# Altium schematic symbol library My_Intlib.SchLib: 107 symbols (part 1 of 2) (continued)
## GD32F307VGT6 (continued)

## Header 2
designator P?
2P接插件; LatestRevisionDate: 17-Jul-2002; LatestRevisionNote: Re-released for DXP Platform.; Publisher: Altium Limited
footprint HDR-1X2_H (弯脚排针，2脚)
footprint HDR-1x2 (排针，2脚)
footprint HDR-1X2_M (排母，2脚)
footprint HDR-1X2_Y (圆孔排母，2脚)
footprint KF128-5.08-2P (螺钉式接线端子，脚距5.08mm)
footprint KF2EDGK5.08-LI-2P (立插端子)
footprint KF2EDGK5.08-WI-2P (卧插端子)
footprint XH2.54-2P
footprint XH2.54-WS-2P (长：10mm，宽：8mm，高：6.1mm)
pins: 1, 2

## Header 3
designator P?
3P接插件; LatestRevisionDate: 17-Jul-2002; LatestRevisionNote: Re-released for DXP Platform.; Publisher: Altium Limited
footprint HDR1X3 (Connector; Header; 3 Position)
footprint HDR-1X3_M (排母，3脚)
footprint HDR-1X3_H (弯脚排针，3脚)
footprint HDR-1X3_Y (圆孔排母，3脚)
pins: 1, 2, 3

## Header 4
designator JP?, comment HDR-1X4  (value not drawn)
4P接插件; 版权归属: 源创客; BOM名称: 4P接插件; 学习资源: www.ooocke.com
footprint XH2.54-WI-4P (接插件，4P)
footprint XH2.54-LI-4P (接插件，4P)
footprint HDR2.54-LI-4P (Footprint not found)
footprint HDR2.54-M-LI-4P (排母，4脚)
footprint HDR2.54-WI-4P (弯脚排针，4脚)
footprint HDR2.54-Y-LI-4P (圆孔排母，4脚)
footprint HDR2.54-M-WS-4P (4P卧式贴片排母2.54)
footprint XH2.54-WS-4P (长：15mm，宽：8mm，高：6.1mm)
pins: 1, 2, 3, 4

## Header 5
designator JP?, comment HDR-1X5  (value not drawn)
5P接插件; 版权归属: 源创客; BOM名称: 5P接插件; 学习资源: www.ooocke.com
footprint XH2.54-WI-5P (接插件，5P)
footprint XH2.54-LI-5P (接插件，5P)
footprint HDR2.54-LI-5P (排针，5脚)
footprint HDR2.54-M-LI-5P (排母，5脚)
footprint HDR2.54-WI-5P (弯脚排针，5脚)
footprint HDR2.54-WS-5P (5P卧式贴片排针2.54)
footprint HDR2.54-Y-LI-5P (圆孔排母，5脚)
footprint HDR2.54-M-WS-5P (5P卧式贴片排母2.54)
footprint KF2510-LI-5P (接插件/2A)
footprint XH2.54-WS-5P (长：17.5mm，宽：8mm，高：6.1mm)
footprint XH2.54-LS-5P (长：17.5mm，宽：6mm，高：8.3mm)
footprint KF2EDGK-2.54-LI-5P (长：14.6mm，宽：8.1mm，高：10.1mm)
footprint KF2EDGK-2.54-WI-5P (长：14.6mm，宽：10.1mm，高：8.1mm)
pins: 1, 2, 3, 4, 5

## Header 5_With_PAD
designator JP?, comment HDR-1X5  (value not drawn)
5P接插件; 版权归属: 源创客; BOM名称: 5P接插件; 学习资源: www.ooocke.com
footprint PH2.0-WS-5P (长：14mm，宽：7.6mm，高：5.5mm)
pins: 0, 1, 2, 3, 4, 5

## Header 10
designator JP?, comment HDR-1X10  (value not drawn)
10P接插件; 版权归属: 源创客; BOM名称: 10P接插件; 学习资源: www.ooocke.com
footprint XH2.54-WI-10P (接插件，10P)
footprint XH2.54-LI-10P (接插件，10P)
footprint HDR2.54-LI-10P (排针，10脚)
footprint HDR2.54-M-LI-10P (排母，10脚)
footprint HDR2.54-WI-10P (弯脚排针，10脚)
footprint HDR2.54-WS-10P (10P卧式贴片排针2.54)
footprint HDR2.54-Y-LI-10P (圆孔排母，10脚)
footprint HDR2.54-M-WS-10P (10P卧式贴片排母2.54)
footprint KF2510-LI-10P (接插件/2A)
footprint XH2.54-WS-10P (长：30mm，宽：8mm，高：6.1mm)
footprint XH2.54-LS-10P (长：30mm，宽：6mm，高：8.3mm)
footprint KF2EDGK-2.54-LI-10P (长：27.3mm，宽：8.1mm，高：10.1mm)
footprint KF2EDGK-2.54-WI-10P (长：27.3mm，宽：10.1mm，高：8.1mm)
pins: 1, 2, 3, 4, 5, 6, 7, 8, 9, 10

## Header 10X2
designator P?
Header, 10-Pin, Dual row; LatestRevisionDate: 17-Jul-2002; LatestRevisionNote: Re-released for DXP Platform.; Publisher: Altium Limited
footprint HDR-10X2 (双排排针，10x2脚)
footprint HDR-10X2_H
pins: 1, 2, 3, 4, 5, 6, 7, 8, 9, 10, 11, 12, 13, 14, 15, 16, 17, 18, 19, 20

## Header 20X2
designator P?
Header, 40-Pin, HDR-SMD_2*20P-P2.54; LatestRevisionDate: 17-Jul-2002; LatestRevisionNote: Re-released for DXP Platform.; Publisher: Altium Limited
footprint HDR-SMD_2*20P-P2.54 (贴片式排母，2*20p，脚距2.54mm，高度8.5mm)
pins: 1, 2, 3, 4, 5, 6, 7, 8, 9, 10, 11, 12, 13, 14, 15, 16, 17, 18, 19, 20, 21, 22, 23, 24, 25, 26, 27, 28, 29, 30, 31, 32, 33, 34, 35, 36, 37, 38, 39, 40

## IRF540N
designator Q?
N沟场 100V/22A; BOM名称: 效应管; 版权归属: 源创客; 学习资源: www.ooocke.com; 描述: N沟场 100V/22A
footprint TO263-3B (263，3脚晶体管)
footprint TO220A (220，3脚晶体管)
pins: 1 G, 2 S, 3 D

## Jump
designator J?
跳线帽
footprint Jump
pins: 1, 2

## KF128-5.08MM-2P
designator J?, comment 3.3V电源输出
大接线端子，绿; ComponentLink1URL: https://detail.tmall.com/item.htm?spm=a1z10.5-b.w4011-14865958799.193.B0p41N&id=45905508377&rn=e90e7252b5175cd006380c5c01151190&abbucket=9; price: 0.5; Supplier: Farpu; SuppliersPartNumber: *; Manufacturer: *; ComponentLink1Description: 供应商链接
footprint WJ500V-5.08-2
pins: 1, 2

## L_SMD
designator L?
贴片电感
footprint L0402
footprint L0603
footprint L0805
footprint L1206
pins: 1, 2

## LD3320
designator U?
“语音识别” 专用芯片; Manufacturer_Name: Electrodragon; Datasheet Link: http://www.electrodragon.com/w/LD3320_Datasheet; Height: 0.9mm; Manufacturer_Part_Number: LD3320
footprint QFN50P700X700X90-49N-D
pins: 1 VDDIO_1 (power), 2 RESERVED_1, 3 RESERVED_2, 4 RESERVED_3, 5 RESERVED_4, 6 RESERVED_5, 7 VDD (power), 8 GNDD_1 (power), 9 MICP, 10 MICN, 11 MONO, 12 MBS, 13 LINL, 14 LINR, 15 HPOL, 16 HPOR, 17 GNDA_1 (power), 18 VREF (power), 19 VDDA_1 (power), 20 EQ1, 21 EQ2, 22 EQ3, 23 VDDA_2 (power), 24 GNDA_2 (power), 25 SPON, 26 SPOP, 27 LOUTL, 28 LOUTR, 29 RESERVED_6, 30 RESERVED_7, 31 CLK (in), 32 VDDIO_2 (power), 33 GNDD_2 (power), 34 P7, 35 P6, 36 P5, 37 P4, 38 P3, 39 P2/SDCK, 40 P1/SDO, 41 P0/SDI, 42 ~{WRB}/~{SPIS}, 43 ~{CBS}/~{SCS}, 44 A0, 45 ~{RDB}, 46 MD, 47 ~{RSTB}, 48 ~{INTB}, 49 EP

## LED_B
designator LED?, comment B
蓝色LED; Published: 8-Jun-2000; Revision: July-2002: Re-released for DXP Platform.; Publisher: Altium Limited
footprint LED 3MM-B (蓝色3mm直插LED)
footprint LED 5MM-B (蓝色5mm直插LED)
footprint LED 0805B (蓝色0805LED)
footprint LED F234-B (蓝色2mm*3mm*4mm(长*宽*高))
footprint LED 0603B (蓝色0603LED)
pins: 1 A, 2 K

## LED_G
designator LED?, comment G
绿色LED; Published: 8-Jun-2000; Revision: July-2002: Re-released for DXP Platform.; Publisher: Altium Limited
footprint LED 3MM-G (绿色3mm直插LED)
footprint LED 5MM-G (绿色5mm直插LED)
footprint LED 0805G (绿色0805LED)
footprint LED F234-G (绿色2mm*3mm*4mm(长*宽*高))
footprint LED 0603G (绿色0603LED)
pins: 1 A, 2 K

## LED_R
designator LED?, comment R
红色LED; Published: 8-Jun-2000; Revision: July-2002: Re-released for DXP Platform.; Publisher: Altium Limited
footprint LED 3MM-R (红色3mm直插LED)
footprint LED 5MM-R (红色5mm直插LED)
footprint LED 0805R (红色0805LED)
footprint LED F234-R (红色2mm*3mm*4mm(长*宽*高))
footprint LED 0603R (红色0603LED)
pins: 1 A, 2 K

## LED_R&G
designator LED?
LED红绿双色，0805，1.6mm*1.5mm; Published: 8-Jun-2000; Revision: July-2002: Re-released for DXP Platform.; Publisher: Altium Limited
footprint LED 0805_R&G (LED红绿双色，0805，1.6mm*1.5mm)
footprint LED 0603-RG (1.5x1.6 mm)
pins: 1 K, 2 K, 3 A, 4 A

## LED_R&G&Y
designator LED?
LED红绿黄3色，5050，5mm*5mm; Published: 8-Jun-2000; Revision: July-2002: Re-released for DXP Platform.; Publisher: Altium Limited
footprint LED 5050 R&G&Y (LED红绿黄3色，5050，5mm*5mm)
pins: 1 K, 2 A, 3 K, 4 A, 5 K, 6 A

## LED_Y
designator LED?, comment Y
黄色LED; Published: 8-Jun-2000; Revision: July-2002: Re-released for DXP Platform.; Publisher: Altium Limited
footprint LED 3MM-Y (黄色3mm直插LED)
footprint LED 5MM-Y (黄色5mm直插LED)
footprint LED 0805Y (黄色0805LED)
footprint LED F234-Y (黄色2mm*3mm*4mm(长*宽*高))
footprint LED 0603Y (黄色0603LED)
pins: 1 A, 2 K

## LMR14020SQDPRRQ1
designator U?
TI的降压转换器，具有 40uA IQ 的 SIMPLE SWITCHER®、汽车类 40V、2A 2.2MHz
footprint WSON-10
pins: 1 BOOT (power), 2 VIN (power), 3 VIN (power), 4 EN (in), 5 RT/SYNC (in), 6 SS, 7 FB (in), 8 PGOOD (in), 9 GND (power), 10 SW, 11 PAD (power)

## LMR51420XDDCR
designator U?
DC/DC 降压转换器 / 500KHz，PFM，Adjustable; Manufacturer_Part_Number: LMR51420XFDDCR; Height: 1.1mm; Mouser Part Number: 595-LMR51420XFDDCR
footprint SOT95P280X110-6N
pins: 1 GND, 2 SW, 3 VIN, 4 FB, 5 EN, 6 CB

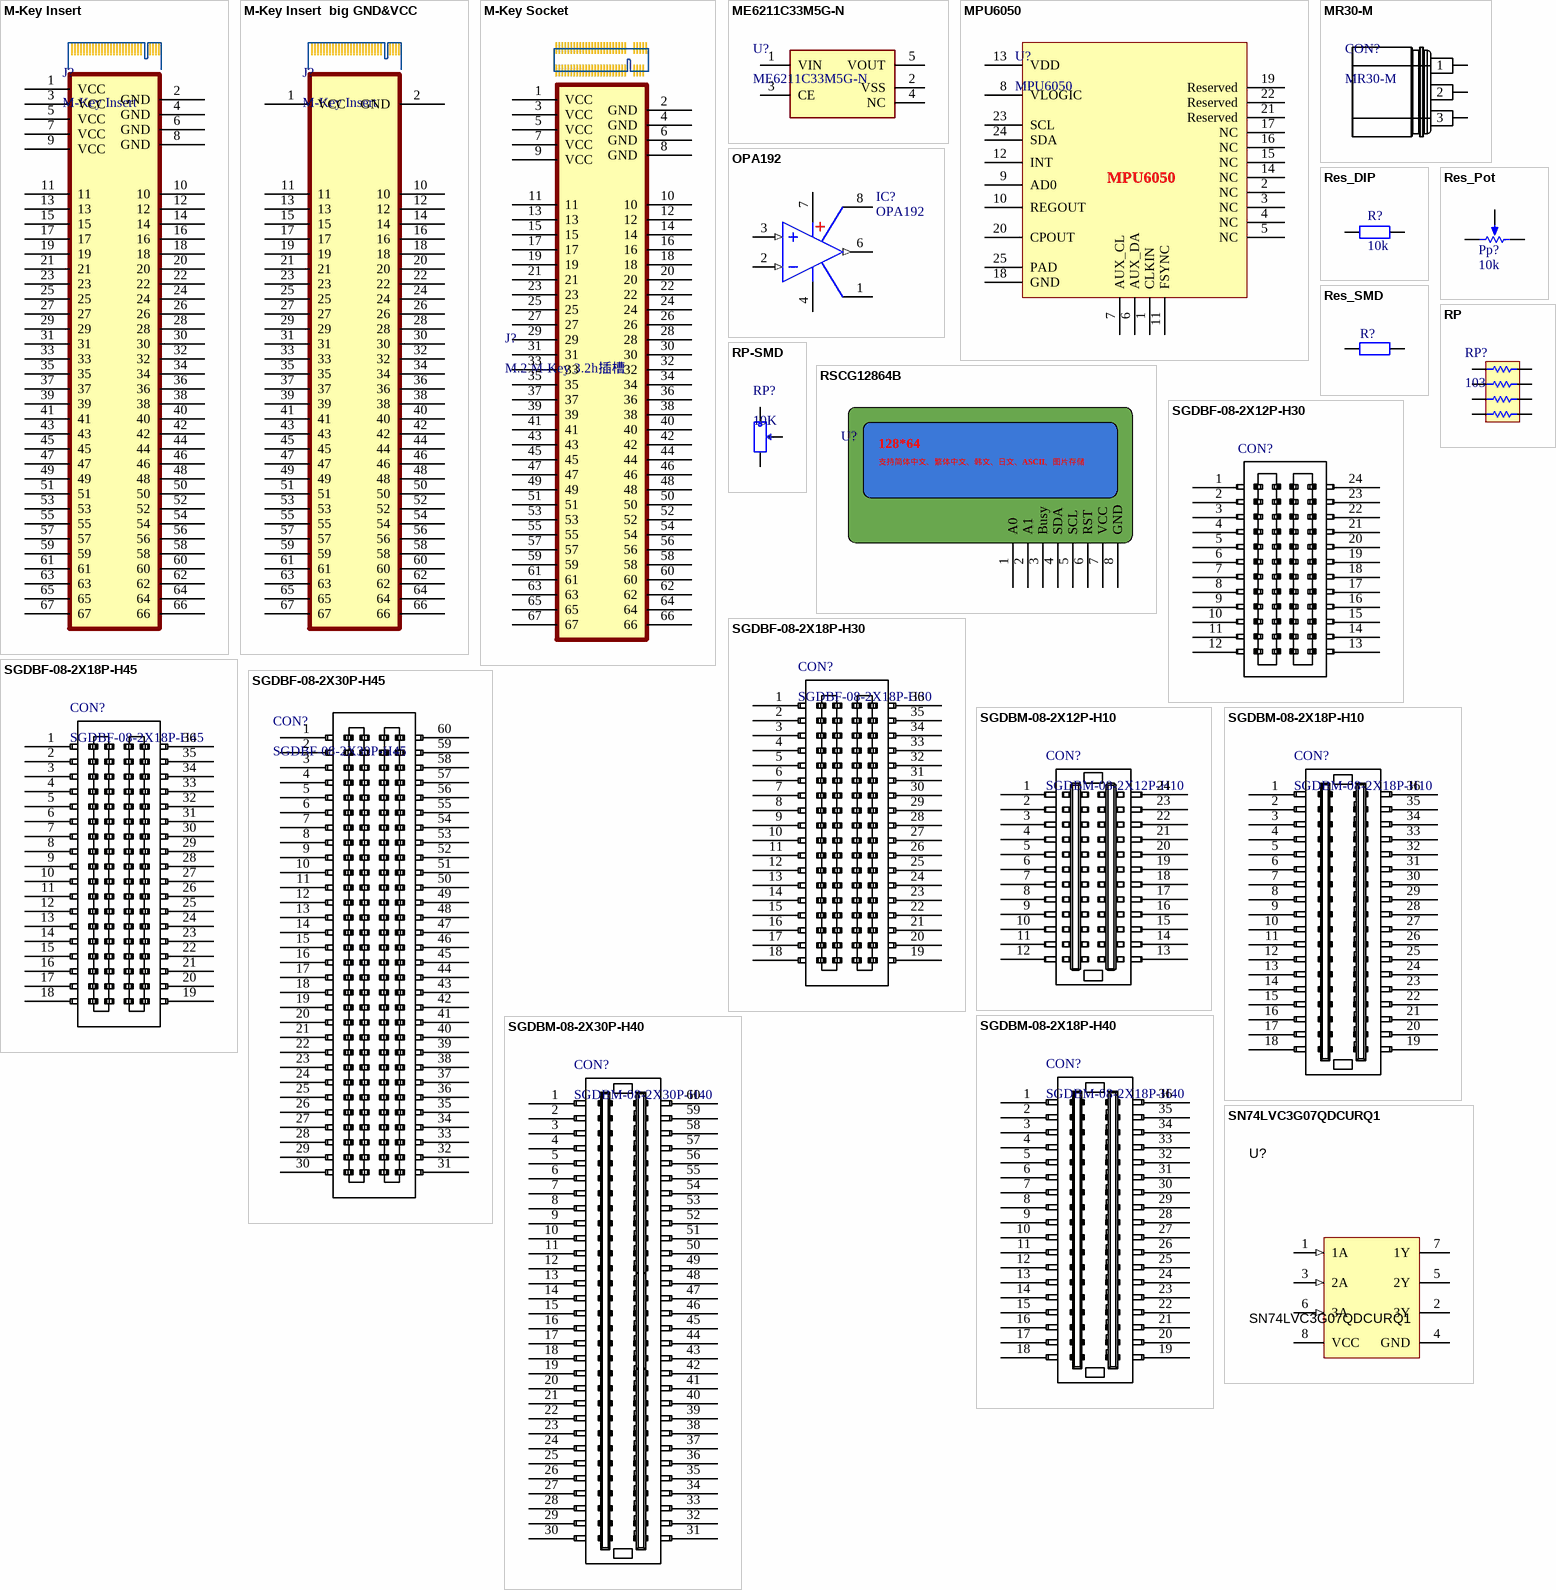
[diagram p3: symbols M-Key Insert to SN74LVC3G07QDCURQ1]

## M-Key Insert
designator J?
M.2 金手指
footprint M-Key Insert (M.2 金手指)
pins: 1 VCC, 2 GND, 3 VCC, 4 GND, 5 VCC, 6 GND, 7 VCC, 8 GND, 9 VCC, 10, 11, 12, 13, 14, 15, 16, 17, 18, 19, 20, 21, 22, 23, 24, 25, 26, 27, 28, 29, 30, 31, 32, 33, 34, 35, 36, 37, 38, 39, 40, 41, 42, 43, 44, 45, 46, 47, 48, 49, 50, 51, 52, 53, 54, 55, 56, 57, 58, 59, 60, 61, 62, 63, 64, 65, 66, 67

## M-Key Insert  big GND&VCC
designator J?, comment M-Key Insert
M.2 金手指
footprint M-Key Insert big GND&VCC (M.2 金手指)
pins: 1 VCC, 2 GND, 10, 11, 12, 13, 14, 15, 16, 17, 18, 19, 20, 21, 22, 23, 24, 25, 26, 27, 28, 29, 30, 31, 32, 33, 34, 35, 36, 37, 38, 39, 40, 41, 42, 43, 44, 45, 46, 47, 48, 49, 50, 51, 52, 53, 54, 55, 56, 57, 58, 59, 60, 61, 62, 63, 64, 65, 66, 67

## M-Key Socket
designator J?, comment M.2 M-Key 3.2h插槽
footprint M-Key Socket (M.2 M-Key 3.2h插槽)
pins: 1 VCC, 2 GND, 3 VCC, 4 GND, 5 VCC, 6 GND, 7 VCC, 8 GND, 9 VCC, 10, 11, 12, 13, 14, 15, 16, 17, 18, 19, 20, 21, 22, 23, 24, 25, 26, 27, 28, 29, 30, 31, 32, 33, 34, 35, 36, 37, 38, 39, 40, 41, 42, 43, 44, 45, 46, 47, 48, 49, 50, 51, 52, 53, 54, 55, 56, 57, 58, 59, 60, 61, 62, 63, 64, 65, 66, 67

## ME6211C33M5G-N
designator U?
LDO芯片，Vin(max)=6V，Vout=3V3，Iout=500mA; Manufacturer_Name: Microne; Datasheet Link: https://datasheet.lcsc.com/szlcsc/1811131510_MICRONE-Nanjing-Micro-One-Elec-ME6211C33M5G-N_C82942.pdf; Height: 1.45mm; Manufacturer_Part_Number: ME6211C33M5G-N
footprint SOT95P270X145-5N
pins: 1 VIN, 2 VSS, 3 CE, 4 NC, 5 VOUT

## MPU6050
designator U?
6轴惯性传感器，只支持IIC协议
footprint QFN24 4x4_N (24脚，长x宽x高：4x4x1mm，脚距：0.5mm)
pins: 1 CLKIN, 2 NC, 3 NC, 4 NC, 5 NC, 6 AUX_DA, 7 AUX_CL, 8 VLOGIC, 9 AD0, 10 REGOUT, 11 FSYNC, 12 INT, 13 VDD, 14 NC, 15 NC, 16 NC, 17 NC, 18 GND, 19 Reserved, 20 CPOUT, 21 Reserved, 22 Reserved, 23 SCL, 24 SDA, 25 PAD

## MR30-M
designator CON?
MR30公头，航模插头连接器大电流
footprint MR30-M (MR30公头，航模插头连接器大电流)
pins: 1, 2, 3

## OPA192
designator IC?
High-Voltage, Rail-to-Rail Input/Output, 5µV, 0.2µV/˚C, Precision Operational Amplifier; BOM名称: 单路精密运放; 版权归属: 源创客; 学习资源: www.ooocke.com
footprint SOP8_N (5*6*1.8mm（长宽高）)
footprint DIP8-300_MH
pins: 1, 2 IN- (in), 3 IN+ (in), 4 V- (power), 6 OUT (out), 7 V+ (power), 8

## Res_DIP
designator R?, comment 10k
直插电阻
footprint RS 1/4W (直插色环电阻，脚距9mm，直径2.3mm)
pins: 1, 2

## Res_Pot
designator Pp?, comment 10k
电位器; 购买链接: https://item.taobao.com/item.htm?spm=a230r.1.14.90.21641e34zQj3ul&id=19303265869&ns=1&abbucket=13#detail
footprint RM065
footprint RP_3296
pins: 1 TOP, 2 TAP, 3 BOT

## Res_SMD
designator R?
贴片电阻; Value: 1K; Published: 8-Jun-2000; LatestRevisionDate: 17-Jul-2002; LatestRevisionNote: Re-released for DXP Platform.; PackageReference: AXIAL-0.4; Publisher: Altium Limited; PackageDescription: Axial Device, Thru-Hole; 2 Leads; 0.4 in Pin Spacing
footprint R0402
footprint R0603
footprint R0805
footprint R1206
pins: 1, 2

## RP
designator RP?, comment 103
贴片网络排阻; 版权归属: 源创客; BOM名称: 贴片网络排阻; 学习资源: www.ooocke.com
footprint RCA-8P4R-0603 (3.2mm*1.6mm*0.6mm(长*宽*厚))
pins: 1, 2, 3, 4, 5, 6, 7, 8

## RP-SMD
designator RP?, comment 10K
贴片电位器; 版权归属: 源创客; BOM名称: 贴片电位器; 学习资源: www.ooocke.com
footprint 3303W (3.5*3.1*1.5mm)
pins: 1, 2, 3

## RSCG12864B
designator U?  (value not drawn)
128*64点阵屏，I2C通信，RSCG12864B
footprint HDR-1X8_M (排母，8脚)
pins: 1 A0, 2 A1, 3 Busy, 4 SDA, 5 SCL, 6 RST, 7 VCC, 8 GND
text: 128*64; 支持简体中文、繁体中文、韩文、日文、ASCII、图片存储

## SGDBF-08-2X12P-H30
designator CON?  (value not drawn)
板对板连接器，母端，脚距0.8mm，2*12pin，高3mm
footprint SGDBF-08-2X12P-H30 (板对板连接器，母端，脚距0.8mm，2*12pin，高3mm)
pins: 1, 2, 3, 4, 5, 6, 7, 8, 9, 10, 11, 12, 13, 14, 15, 16, 17, 18, 19, 20, 21, 22, 23, 24

## SGDBF-08-2X18P-H30
designator CON?
板对板连接器，母端，脚距0.8mm，2*18pin，高3mm
footprint SGDBF-08-2X18P-H30 (板对板连接器，母端，脚距0.8mm，2*18pin，高3mm)
pins: 1, 2, 3, 4, 5, 6, 7, 8, 9, 10, 11, 12, 13, 14, 15, 16, 17, 18, 19, 20, 21, 22, 23, 24, 25, 26, 27, 28, 29, 30, 31, 32, 33, 34, 35, 36

## SGDBF-08-2X18P-H45
designator CON?
板对板连接器，母端，脚距0.8mm，2*18pin，高4.5mm
footprint SGDBF-08-2X18P-H45 (板对板连接器，母端，脚距0.8mm，2*18pin，高4.5mm)
pins: 1, 2, 3, 4, 5, 6, 7, 8, 9, 10, 11, 12, 13, 14, 15, 16, 17, 18, 19, 20, 21, 22, 23, 24, 25, 26, 27, 28, 29, 30, 31, 32, 33, 34, 35, 36

## SGDBF-08-2X30P-H45
designator CON?
板对板连接器，母端，脚距0.8mm，2*30pin，高4.5mm
footprint SGDBF-08-2X30P-H45 (板对板连接器，母端，脚距0.8mm，2*30pin，高4.5mm)
pins: 1, 2, 3, 4, 5, 6, 7, 8, 9, 10, 11, 12, 13, 14, 15, 16, 17, 18, 19, 20, 21, 22, 23, 24, 25, 26, 27, 28, 29, 30, 31, 32, 33, 34, 35, 36, 37, 38, 39, 40, 41, 42, 43, 44, 45, 46, 47, 48, 49, 50, 51, 52, 53, 54, 55, 56, 57, 58, 59, 60

## SGDBM-08-2X12P-H10
designator CON?
板对板连接器，公端，脚距0.8mm，2*12pin，高1mm
footprint SGDBM-08-2X12P-H10 (板对板连接器，公端，脚距0.8mm，2*12pin，高1mm)
pins: 1, 2, 3, 4, 5, 6, 7, 8, 9, 10, 11, 12, 13, 14, 15, 16, 17, 18, 19, 20, 21, 22, 23, 24

## SGDBM-08-2X18P-H10
designator CON?
板对板连接器，公端，脚距0.8mm，2*18pin，高1mm
footprint SGDBM-08-2X18P-H10 (板对板连接器，公端，脚距0.8mm，2*18pin，高1mm)
pins: 1, 2, 3, 4, 5, 6, 7, 8, 9, 10, 11, 12, 13, 14, 15, 16, 17, 18, 19, 20, 21, 22, 23, 24, 25, 26, 27, 28, 29, 30, 31, 32, 33, 34, 35, 36

## SGDBM-08-2X18P-H40
designator CON?
板对板连接器，公端，脚距0.8mm，2*18pin，高4mm
footprint SGDBM-08-2X18P-H40 (板对板连接器，公端，脚距0.8mm，2*18pin，高4mm)
pins: 1, 2, 3, 4, 5, 6, 7, 8, 9, 10, 11, 12, 13, 14, 15, 16, 17, 18, 19, 20, 21, 22, 23, 24, 25, 26, 27, 28, 29, 30, 31, 32, 33, 34, 35, 36

## SGDBM-08-2X30P-H40
designator CON?
板对板连接器，公端，脚距0.8mm，2*30pin，高4mm
footprint SGDBM-08-2X30P-H40 (板对板连接器，公端，脚距0.8mm，2*30pin，高4.0mm)
pins: 1, 2, 3, 4, 5, 6, 7, 8, 9, 10, 11, 12, 13, 14, 15, 16, 17, 18, 19, 20, 21, 22, 23, 24, 25, 26, 27, 28, 29, 30, 31, 32, 33, 34, 35, 36, 37, 38, 39, 40, 41, 42, 43, 44, 45, 46, 47, 48, 49, 50, 51, 52, 53, 54, 55, 56, 57, 58, 59, 60

## SN74LVC3G07QDCURQ1
designator U?
TRIPLE BUFFER/DRIVER WITH OPEN-DRAIN OUTPUTS, DCU0008A; Manufacturer: Texas Instruments; SymbolCreator: a0412235; CompType: IC; U/M: EA; SymbolVersion: 2014-08-13; PartNumber: SN74LVC3G07QDCURQ1; PackageReference: DCU0008A; MountType: SMT; ComponentLink1Description: Datasheet Link; ComponentLink1URL: http://www.ti.com/lit/ds/symlink/sn74lvc3g07-q1.pdf; RoHS: Y; Publisher: Texas Instruments; LatestRevisionDate: 2015-12-28; Alternate Manufacturer: Texas Instruments
footprint SOP50P310X90-8N
pins: 1 1A (in), 2 3Y (oc), 3 2A (in), 4 GND (power), 5 2Y (oc), 6 3A (in), 7 1Y (oc), 8 VCC (power)

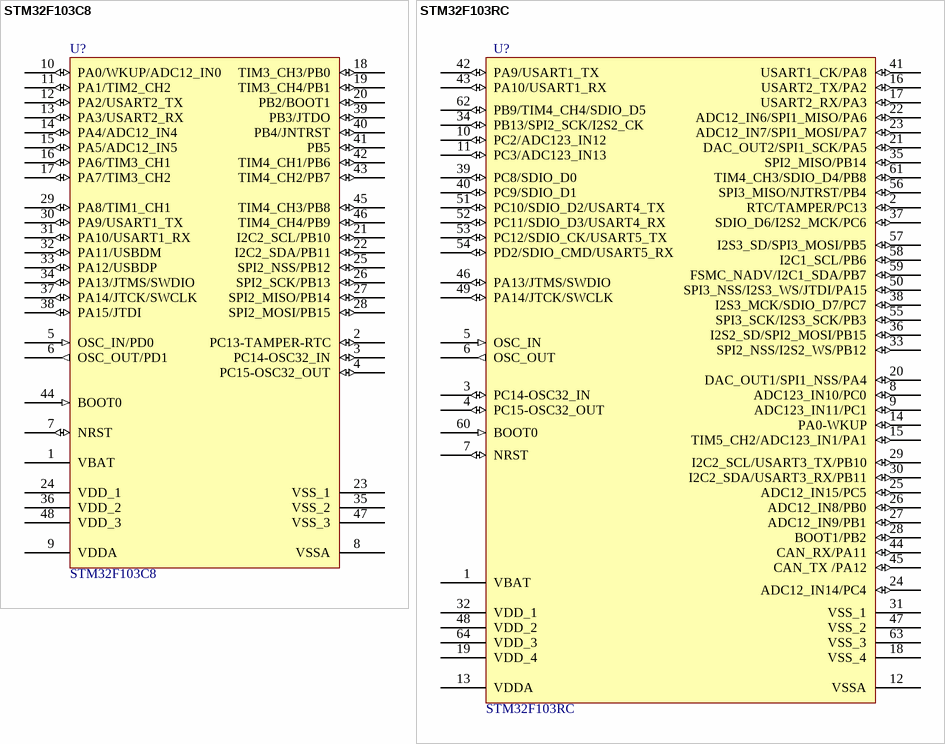
[diagram p4: symbols STM32F103C8 to STM32F103RC]

## STM32F103C8
designator U?
Flaah:64/RAM:20/IO:36; BOM名称: 32位STM单片机
footprint LQFP48 7X7_N (48脚，体宽7x7mm，脚距0.5mm)
pins: 1 VBAT (power), 2 PC13-TAMPER-RTC (io), 3 PC14-OSC32_IN (io), 4 PC15-OSC32_OUT (io), 5 OSC_IN/PD0 (in), 6 OSC_OUT/PD1 (out), 7 NRST (io), 8 VSSA (power), 9 VDDA (power), 10 PA0/WKUP/ADC12_IN0 (io), 11 PA1/TIM2_CH2 (io), 12 PA2/USART2_TX (io), 13 PA3/USART2_RX (io), 14 PA4/ADC12_IN4 (io), 15 PA5/ADC12_IN5 (io), 16 PA6/TIM3_CH1  (io), 17 PA7/TIM3_CH2 (io), 18 TIM3_CH3/PB0 (io), 19 TIM3_CH4/PB1 (io), 20 PB2/BOOT1 (io), 21 I2C2_SCL/PB10 (io), 22 I2C2_SDA/PB11 (io), 23 VSS_1 (power), 24 VDD_1 (power), 25 SPI2_NSS/PB12 (io), 26 SPI2_SCK/PB13 (io), 27 SPI2_MISO/PB14 (io), 28 SPI2_MOSI/PB15 (io), 29 PA8/TIM1_CH1 (io), 30 PA9/USART1_TX (io), 31 PA10/USART1_RX (io), 32 PA11/USBDM (io), 33 PA12/USBDP (io), 34 PA13/JTMS/SWDIO (io), 35 VSS_2 (power), 36 VDD_2 (power), 37 PA14/JTCK/SWCLK (io), 38 PA15/JTDI (io), 39 PB3/JTDO (io), 40 PB4/JNTRST (io), 41 PB5 (io), 42 TIM4_CH1/PB6 (io), 43 TIM4_CH2/PB7 (io), 44 BOOT0 (in), 45 TIM4_CH3/PB8 (io), 46 TIM4_CH4/PB9 (io), 47 VSS_3 (power), 48 VDD_3 (power)

## STM32F103RC
designator U?
32位STM单片机; BOM名称: 32位STM单片机
footprint LQFP64 10X10_N (64脚，体宽10x10mm，脚距0.5mm)
pins: 1 VBAT (power), 2 RTC/TAMPER/PC13 (io), 3 PC14-OSC32_IN (io), 4 PC15-OSC32_OUT (io), 5 OSC_IN (in), 6 OSC_OUT (out), 7 NRST (io), 8 ADC123_IN10/PC0 (io), 9 ADC123_IN11/PC1 (io), 10 PC2/ADC123_IN12 (io), 11 PC3/ADC123_IN13 (io), 12 VSSA (power), 13 VDDA (power), 14 PA0-WKUP (io), 15 TIM5_CH2/ADC123_IN1/PA1 (io), 16 USART2_TX/PA2 (io), 17 USART2_RX/PA3 (io), 18 VSS_4 (power), 19 VDD_4 (power), 20 DAC_OUT1/SPI1_NSS/PA4 (io), 21 DAC_OUT2/SPI1_SCK/PA5 (io), 22 ADC12_IN6/SPI1_MISO/PA6 (io), 23 ADC12_IN7/SPI1_MOSI/PA7 (io), 24 ADC12_IN14/PC4 (io), 25 ADC12_IN15/PC5 (io), 26 ADC12_IN8/PB0 (io), 27 ADC12_IN9/PB1 (io), 28 BOOT1/PB2 (io), 29 I2C2_SCL/USART3_TX/PB10 (io), 30 I2C2_SDA/USART3_RX/PB11 (io), 31 VSS_1, 32 VDD_1 (power), 33 SPI2_NSS/I2S2_WS/PB12 (io), 34 PB13/SPI2_SCK/I2S2_CK (io), 35 SPI2_MISO/PB14 (io), 36 I2S2_SD/SPI2_MOSI/PB15 (io), 37 SDIO_D6/I2S2_MCK/PC6 (io), 38 I2S3_MCK/SDIO_D7/PC7 (io), 39 PC8/SDIO_D0 (io), 40 PC9/SDIO_D1 (io), 41 USART1_CK/PA8 (io), 42 PA9/USART1_TX (io), 43 PA10/USART1_RX (io), 44 CAN_RX/PA11 (io), 45 CAN_TX /PA12 (io), 46 PA13/JTMS/SWDIO (io), 47 VSS_2, 48 VDD_2 (power), 49 PA14/JTCK/SWCLK (io), 50 SPI3_NSS/I2S3_WS/JTDI/PA15 (io), 51 PC10/SDIO_D2/USART4_TX (io), 52 PC11/SDIO_D3/USART4_RX (io), 53 PC12/SDIO_CK/USART5_TX (io), 54 PD2/SDIO_CMD/USART5_RX (io), 55 SPI3_SCK/I2S3_SCK/PB3 (io), 56 SPI3_MISO/NJTRST/PB4 (io), 57 I2S3_SD/SPI3_MOSI/PB5 (io), 58 I2C1_SCL/PB6 (io), 59 FSMC_NADV/I2C1_SDA/PB7 (io), 60 BOOT0 (in), 61 TIM4_CH3/SDIO_D4/PB8 (io), 62 PB9/TIM4_CH4/SDIO_D5 (io), 63 VSS_3 (power), 64 VDD_3 (power)

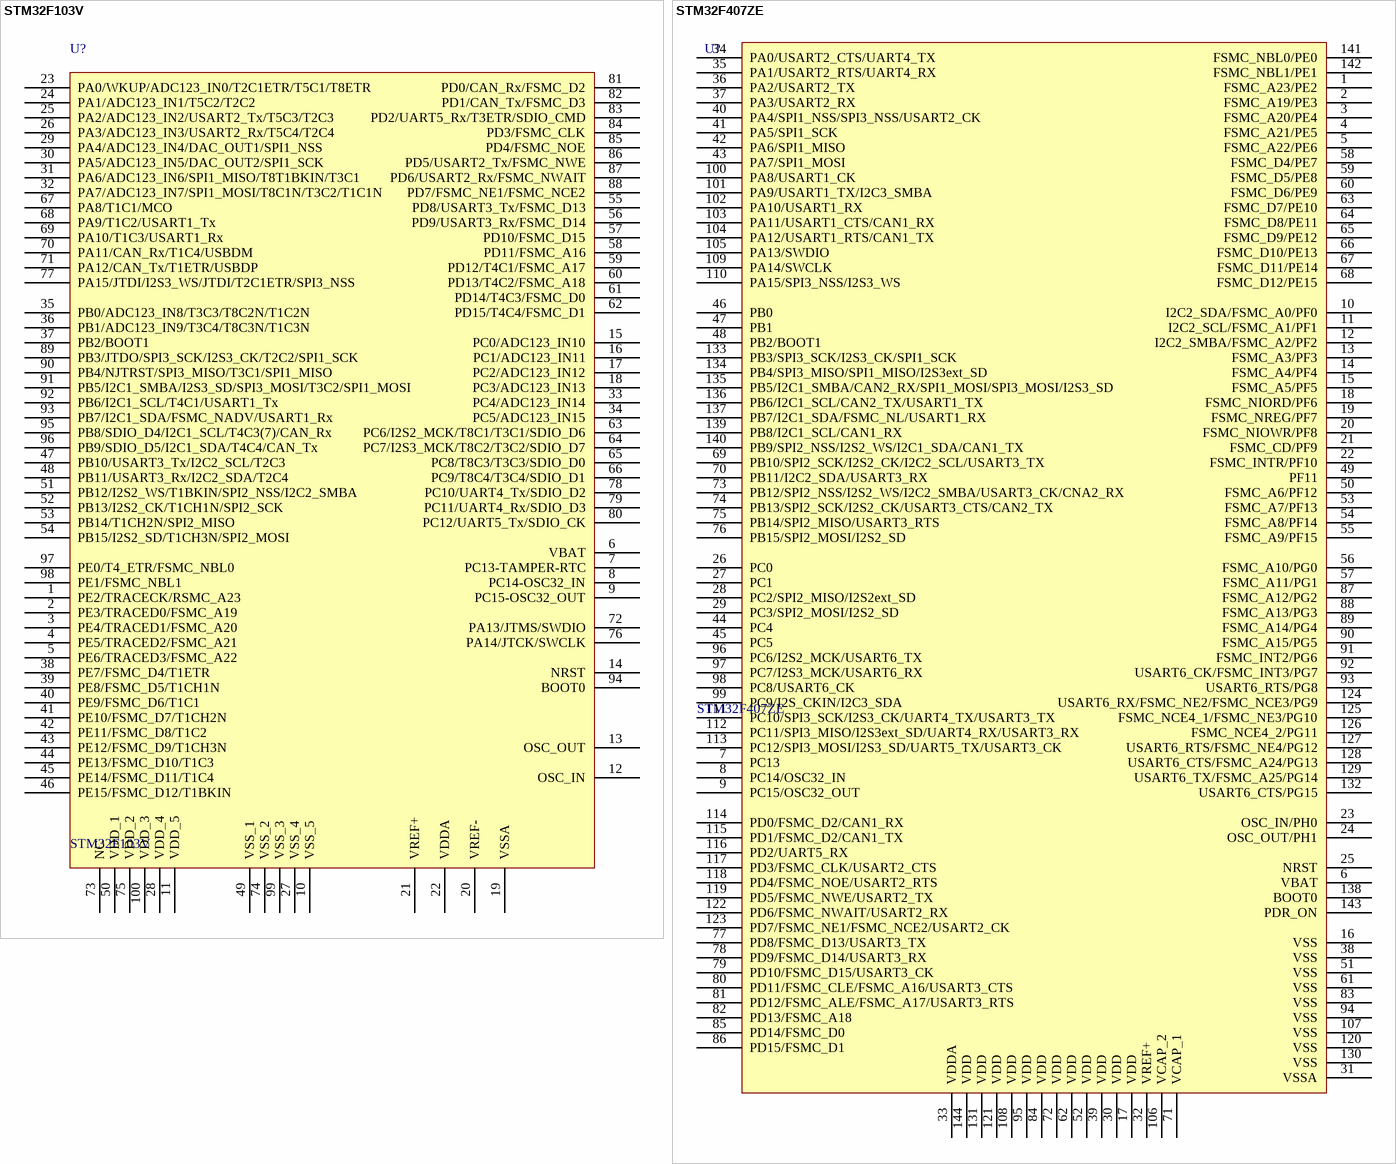
[diagram p5: symbols STM32F103V to STM32F407ZE]

## STM32F103V
designator U?
32位STM单片机100引脚; BOM名称: 32位STM单片机100引脚
footprint LQFP100 14X14_N (100脚，体宽14x14mm，脚距0.5mm)
pins: 1 PE2/TRACECK/RSMC_A23, 2 PE3/TRACED0/FSMC_A19, 3 PE4/TRACED1/FSMC_A20, 4 PE5/TRACED2/FSMC_A21, 5 PE6/TRACED3/FSMC_A22, 6 VBAT, 7 PC13-TAMPER-RTC, 8 PC14-OSC32_IN, 9 PC15-OSC32_OUT, 10 VSS_5, 11 VDD_5, 12 OSC_IN, 13 OSC_OUT, 14 NRST, 15 PC0/ADC123_IN10, 16 PC1/ADC123_IN11, 17 PC2/ADC123_IN12, 18 PC3/ADC123_IN13, 19 VSSA, 20 VREF-, 21 VREF+, 22 VDDA, 23 PA0/WKUP/ADC123_IN0/T2C1ETR/T5C1/T8ETR, 24 PA1/ADC123_IN1/T5C2/T2C2, 25 PA2/ADC123_IN2/USART2_Tx/T5C3/T2C3, 26 PA3/ADC123_IN3/USART2_Rx/T5C4/T2C4, 27 VSS_4, 28 VDD_4, 29 PA4/ADC123_IN4/DAC_OUT1/SPI1_NSS, 30 PA5/ADC123_IN5/DAC_OUT2/SPI1_SCK, 31 PA6/ADC123_IN6/SPI1_MISO/T8T1BKIN/T3C1, 32 PA7/ADC123_IN7/SPI1_MOSI/T8C1N/T3C2/T1C1N, 33 PC4/ADC123_IN14, 34 PC5/ADC123_IN15, 35 PB0/ADC123_IN8/T3C3/T8C2N/T1C2N, 36 PB1/ADC123_IN9/T3C4/T8C3N/T1C3N, 37 PB2/BOOT1, 38 PE7/FSMC_D4/T1ETR, 39 PE8/FSMC_D5/T1CH1N, 40 PE9/FSMC_D6/T1C1, 41 PE10/FSMC_D7/T1CH2N, 42 PE11/FSMC_D8/T1C2, 43 PE12/FSMC_D9/T1CH3N, 44 PE13/FSMC_D10/T1C3, 45 PE14/FSMC_D11/T1C4, 46 PE15/FSMC_D12/T1BKIN, 47 PB10/USART3_Tx/I2C2_SCL/T2C3, 48 PB11/USART3_Rx/I2C2_SDA/T2C4, 49 VSS_1, 50 VDD_1, 51 PB12/I2S2_WS/T1BKIN/SPI2_NSS/I2C2_SMBA, 52 PB13/I2S2_CK/T1CH1N/SPI2_SCK, 53 PB14/T1CH2N/SPI2_MISO, 54 PB15/I2S2_SD/T1CH3N/SPI2_MOSI, 55 PD8/USART3_Tx/FSMC_D13, 56 PD9/USART3_Rx/FSMC_D14, 57 PD10/FSMC_D15, 58 PD11/FSMC_A16, 59 PD12/T4C1/FSMC_A17, 60 PD13/T4C2/FSMC_A18, 61 PD14/T4C3/FSMC_D0, 62 PD15/T4C4/FSMC_D1, 63 PC6/I2S2_MCK/T8C1/T3C1/SDIO_D6, 64 PC7/I2S3_MCK/T8C2/T3C2/SDIO_D7, 65 PC8/T8C3/T3C3/SDIO_D0, 66 PC9/T8C4/T3C4/SDIO_D1, 67 PA8/T1C1/MCO, 68 PA9/T1C2/USART1_Tx, 69 PA10/T1C3/USART1_Rx, 70 PA11/CAN_Rx/T1C4/USBDM, 71 PA12/CAN_Tx/T1ETR/USBDP, 72 PA13/JTMS/SWDIO, 73 NC, 74 VSS_2, 75 VDD_2, 76 PA14/JTCK/SWCLK, 77 PA15/JTDI/I2S3_WS/JTDI/T2C1ETR/SPI3_NSS, 78 PC10/UART4_Tx/SDIO_D2, 79 PC11/UART4_Rx/SDIO_D3, 80 PC12/UART5_Tx/SDIO_CK, 81 PD0/CAN_Rx/FSMC_D2, 82 PD1/CAN_Tx/FSMC_D3, 83 PD2/UART5_Rx/T3ETR/SDIO_CMD, 84 PD3/FSMC_CLK, 85 PD4/FSMC_NOE, 86 PD5/USART2_Tx/FSMC_NWE, 87 PD6/USART2_Rx/FSMC_NWAIT, 88 PD7/FSMC_NE1/FSMC_NCE2, 89 PB3/JTDO/SPI3_SCK/I2S3_CK/T2C2/SPI1_SCK, 90 PB4/NJTRST/SPI3_MISO/T3C1/SPI1_MISO, 91 PB5/I2C1_SMBA/I2S3_SD/SPI3_MOSI/T3C2/SPI1_MOSI, 92 PB6/I2C1_SCL/T4C1/USART1_Tx, 93 PB7/I2C1_SDA/FSMC_NADV/USART1_Rx, 94 BOOT0, 95 PB8/SDIO_D4/I2C1_SCL/T4C3(7)/CAN_Rx, 96 PB9/SDIO_D5/I2C1_SDA/T4C4/CAN_Tx, 97 PE0/T4_ETR/FSMC_NBL0, 98 PE1/FSMC_NBL1, 99 VSS_3, 100 VDD_3